# Altium footprint library Velvet_Controller_v1.1_2022.PcbLib: 82 footprints (part 1 of 6)
Each footprint in its own frame and in the unit in brackets; x right, y up, seen from the top. Pads: shape width x height; smd on the part's side, far side on the other; paste and mask are expansions set on the pad; w line width, h text height; cw(c..) or ccw(c..) is an arc to the next point about the centre after c.
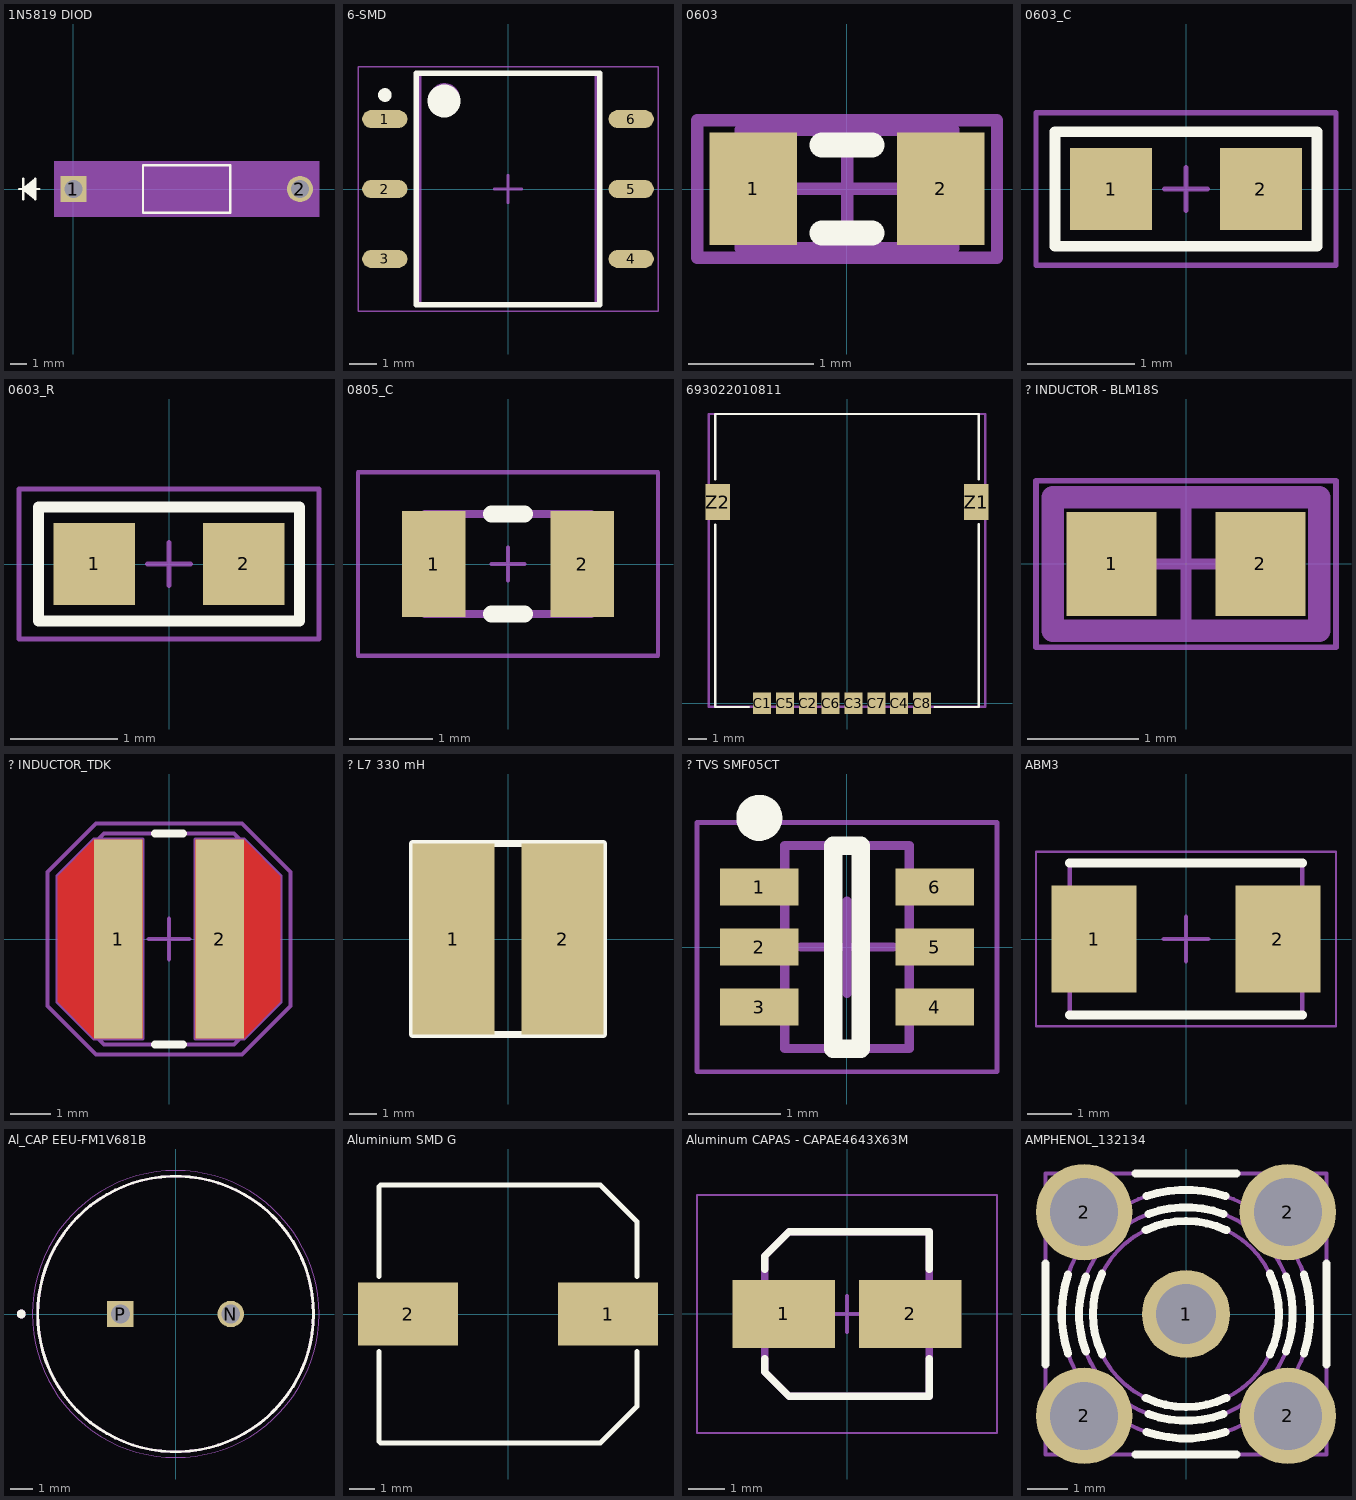
[diagram p0: the footprints below, top view; thin cyan lines are the x and y axes]

## 1N5819 DIOD [mil] "DO-41_STM"
pads (2):
  rect 64x64 hole 44 mask+0: 1(0,0)
  round 64 hole 44 mask+0: 2(557,0)
Top Overlay:
  lines w6: -134,0 -84,0 ; -124,-25 -124,25 ; -94,-20 -124,0 ; -94,-15 -124,0 ; -94,-10 -124,0 ; -94,-5 -124,0 ; -94,5 -124,0 ; -94,10 -124,0 ; -94,15 -124,0 ; -94,20 -124,0 ; -124,0 -94,25 -94,-25 -124,0 ; 171,-58 386,-58 386,58 171,58 171,-58
Mechanical 5:
  region: 604,-68 -47,-68 -47,68 604,68
Mechanical 13:
  lines w1: -134,0 -84,0 ; -124,-25 -124,25 ; -94,-20 -124,0 ; -94,-15 -124,0 ; -94,-10 -124,0 ; -94,-5 -124,0 ; -94,5 -124,0 ; -94,10 -124,0 ; -94,15 -124,0 ; -94,20 -124,0 ; 0,0 176,0 ; 381,0 557,0 ; -124,0 -94,25 -94,-25 -124,0 ; 176,-53 381,-53 381,53 176,53 176,-53
Mechanical 15:
  region: 166,-42 -42,-42 -42,42 166,42 166,63 391,63 391,42 599,42 599,-42 391,-42 391,-63 166,-63
  region: 381,-53 176,-53 176,53 381,53
  lines w6: -42,-42 -42,42 166,42 166,63 391,63 391,42 599,42 599,-42 391,-42 391,-63 166,-63 166,-42 -42,-42
3D body "DO-41_STM.step": height 106.06, standoff -100, extent -17.01,-53.1 574.02,53.1

## 6-SMD [mm] "Body 8.3x6.3mm; pitch 2.54mm"
height 4.5
pads (6):
  oval 1.65x0.65 smd: 1(-4.475,2.54) 2(-4.475,0) 3(-4.475,-2.54) 4(4.475,-2.54) 5(4.475,0) 6(4.475,2.54)
Top Overlay:
  circle w0.6: c-2.325,3.2 r0.3
  circle w0.25: c-4.475,3.415 r0.125
  lines w0.2: -3.325,-4.2 3.325,-4.2 3.325,4.2 -3.325,4.2 -3.325,-4.2
Mechanical 13:
  circle w0.1: c-2.3,3.3 r0.5
  lines w0.1: -3.2,-4.2 3.2,-4.2 3.2,4.2 -3.2,4.2 -3.2,-4.2
Mechanical 15:
  lines w0.05: -5.45,-4.45 5.45,-4.45 5.45,4.45 -5.45,4.45 -5.45,-4.45
  lines w0.1: -0.5,0 0.5,0 ; 0,-0.5 0,0.5
3D body "User Library-SOP-6.step": height 4.08, standoff 0, extent -4.575,-4.23 4.59,4.28

## 0603 [mm] "Chip Resistor, Body 1.6x0.8mm, IPC High Density"
height 0.9
pads (2):
  rect 0.7x0.9 smd: 1(-0.75,0) 2(0.75,0)
Top Overlay:
  lines w0.2: -0.2,-0.35 0.2,-0.35 ; -0.2,0.35 0.2,0.35
Mechanical 13:
  lines w0.1: -0.85,-0.475 0.85,-0.475 0.85,0.475 -0.85,0.475 -0.85,-0.475
Mechanical 15:
  lines w0.1: -0.475,0 0.475,0 ; 0,-0.475 0,0.475 ; -1.2,-0.55 1.2,-0.55 1.2,0.55 -1.2,0.55 -1.2,-0.55
3D body "0603.STEP": height 0.95, standoff 0, extent -0.8,-0.4 0.8,0.4

## 0603_C [mil] "Capacitor"
height 33.46
pads (2):
  rect 30x30 smd: 1(-27.5,0) 2(27.5,0)
Top Overlay:
  lines w4: -48,-21 -48,21 48,21 48,-21 -48,-21
Mechanical 15:
  lines w1.97: -7.87,0 7.87,0 ; 0,-7.87 0,7.87 ; -55,-28 -55,28 55,28 55,-28 -55,-28
3D body: height 33.46, standoff 0, extent -34.9,-15 -23.09,15
3D body: height 33.46, standoff 0, extent 23.1,-15 34.91,15
3D body: height 33.46, standoff 0, extent -23.05,-15 23.05,15

## 0603_R [mil]
height 23.62
pads (2):
  rect 30x30 smd: 1(-27.5,0) 2(27.5,0)
Top Overlay:
  lines w4: -48,-21 -48,21 48,21 48,-21 -48,-21
Mechanical 15:
  lines w1.97: -7.87,0 0,0 ; 0,-7.87 0,0 ; 0,7.87 0,0 ; 7.87,0 0,0 ; -55.12,-27.56 55.12,-27.56 55.12,27.56 -55.12,27.56 -55.12,-27.56
3D body: height 23.62, standoff 0, extent -23.04,-15 23.05,15
3D body: height 23.62, standoff 0, extent -34.9,-15 -23.09,15
3D body: height 23.62, standoff 0, extent 23.1,-15 34.91,15

## 0805_C [mil]
height 21.65
pads (2):
  rect 30x50 smd: 1(-35,0) 2(35,0)
Top Overlay:
  lines w7.87: -7.87,-23.62 7.87,-23.62 ; -7.87,23.62 7.87,23.62
Mechanical 13:
  lines w3.94: -31.5,-23.62 -31.5,23.62 ; 31.5,-23.62 31.5,23.62 ; -39.37,-23.62 -39.37,23.62 39.37,23.62 39.37,-23.62 -39.37,-23.62
Mechanical 15:
  lines w1.97: -7.87,0 0,0 ; 0,-7.87 0,7.87 ; 7.87,0 0,0 ; 0,0 0,0 ; -70.87,-43.31 -70.87,43.31 70.87,43.31 70.87,-43.31 -70.87,-43.31
3D body: height 21.65, standoff 0, extent -39.35,-23.6 -31.52,23.6
3D body: height 21.65, standoff 0, extent 31.52,-23.6 39.35,23.6
3D body: height 21.65, standoff 0, extent -31.5,-23.62 31.52,23.62

## 693022010811 [mm]
pads (10):
  rect 1x1.2 smd: C1(-4.72,0) C2(-2.18,0) C3(0.36,0) C4(2.9,0) C5(-3.45,0) C6(-0.91,0) C7(1.63,0) C8(4.17,0)
  rect 1.35x2 smd: Z1(7.2,11.2) Z2(-7.2,11.2)
Top Overlay:
  lines w0.127: -7.33,9.95 -7.33,-0.21 -5.475,-0.21 ; -7.33,12.45 -7.33,16.1 7.33,16.1 7.33,12.475 ; 4.875,-0.21 7.33,-0.21 7.33,9.975
Mechanical 13:
  lines w0.127: -7.7,-0.2 -7.7,16.1 7.7,16.1 7.7,-0.2 -7.7,-0.2
3D body "693022010811.stp": height 2.07, standoff -0.06, extent -7.7,-0.21 7.7,16.09

## ? INDUCTOR - BLM18S [mm] "Chip Inductor, 2-Leads, Body 1,60x0,80mm, IPC Medium Density"
height 0.6
pads (2):
  rect 0.81x0.94 smd: 1(-0.67,0) 2(0.67,0)
Mechanical 13:
  lines w0.2: -1.2,-0.6 -1.2,0.6 1.2,0.6 1.2,-0.6 -1.2,-0.6
Mechanical 15:
  lines w0.05: -1.35,-0.75 -1.35,0.75 1.35,0.75 1.35,-0.75 -1.35,-0.75
  lines w0.1: -0.5,0 0.5,0 ; 0,-0.5 0,0.5
3D body: height 0.6, standoff 0, extent -0.45,-0.45 0.45,0.45
3D body: height 0.6, standoff 0, extent -0.85,-0.45 -0.45,0.45
3D body: height 0.6, standoff 0, extent 0.45,-0.45 0.85,0.45

## ? INDUCTOR_TDK [mm] "VLS252012T-2R2M1R3"
height 2
pads (2):
  rect 1.2x4.9 smd: 1(-1.25,0) 2(1.25,0)
Top Layer:
  region: 2.75,1.55 1.85,2.45 0.65,2.45 0.65,-2.45 1.85,-2.45 2.75,-1.55
  region: -2.75,-1.55 -1.85,-2.45 -0.65,-2.45 -0.65,2.45 -1.85,2.45 -2.75,1.55
Top Overlay:
  lines w0.2: -0.35,-2.6 0.35,-2.6 ; -0.35,2.6 0.35,2.6
Top Paste:
  region: 2.75,1.55 1.85,2.45 0.65,2.45 0.65,-2.45 1.85,-2.45 2.75,-1.55
  region: -2.75,-1.55 -1.85,-2.45 -0.65,-2.45 -0.65,2.45 -1.85,2.45 -2.75,1.55
Top Solder:
  region: -2.85,-1.591 -1.891,-2.55 -0.55,-2.55 -0.55,2.55 -1.891,2.55 -2.85,1.591
  region: 2.85,1.591 1.891,2.55 0.55,2.55 0.55,-2.55 1.891,-2.55 2.85,-1.591
Mechanical 8:
  lines w0.1: -2.2,0 -1.7,0 ; -1.7,-0.5 -1.7,0 ; -1.7,0.5 -1.7,0 ; -1.25,-0.5 -1.25,0 ; -1.25,0.5 -1.25,0 ; -0.75,0 -1.25,0 ; -0.5,0 0,0 ; 0,-0.5 0,0 ; 0,0.5 0,0 ; 0.5,0 0,0 ; 0.75,0 1.25,0 ; 1.25,-0.5 1.25,0 ; 1.25,0.5 1.25,0 ; 1.7,-0.5 1.7,0 ; 1.7,0.5 1.7,0 ; 2.2,0 1.7,0 ; -2.75,-1.55 -1.85,-2.45 -0.65,-2.45 -0.65,2.45 -1.85,2.45 -2.75,1.55 -2.75,-1.55 ; 0.65,-2.45 1.85,-2.45 2.75,-1.55 2.75,1.55 1.85,2.45 0.65,2.45 0.65,-2.45
Mechanical 14:
  lines w0.1: -2.6,-1.6 -2.6,1.6 -1.6,2.6 1.6,2.6 2.6,1.6 2.6,-1.6 1.6,-2.6 -1.6,-2.6 -2.6,-1.6
Mechanical 15:
  lines w0.1: -3,-1.654 -1.804,-2.85 1.804,-2.85 3,-1.654 3,1.654 1.804,2.85 -1.804,2.85 -3,1.654 -3,-1.654
3D body "IND_TDK_VLCF5020-1.stp": height 2, standoff 0, extent -2.6,-2.6 2.6,2.6

## ? L7 330 mH [mm] "7x7x4mm inductor"
height 4
pads (2):
  rect 3x7 smd: 1(-2,0) 2(2,0)
Top Overlay:
  lines w0.254: -3.5,-3.5 -3.5,3.5 3.5,3.5 3.5,-3.5 -3.5,-3.5
3D body: height 4.1, standoff 0.1, extent -2.5,-2.497 2.5,2.497
3D body: height 4, standoff 0, extent -3.5,-3.5 3.5,3.5

## ? TVS SMF05CT [mm] "SOT363, 6-Leads"
height 1.1
pads (6):
  rect 0.85x0.4 smd: 1(-0.95,0.65) 2(-0.95,0) 3(-0.95,-0.65) 4(0.95,-0.65) 5(0.95,0) 6(0.95,0.65)
Top Overlay:
  circle w0.25: c-0.95,1.4 r0.125
  lines w0.2: -0.15,-1.1 0.15,-1.1 0.15,1.1 -0.15,1.1 -0.15,-1.1
Mechanical 13:
  lines w0.1: -0.675,-1.1 -0.675,1.1 0.675,1.1 0.675,-1.1 -0.675,-1.1
Mechanical 15:
  lines w0.05: -1.625,-1.35 -1.625,1.35 1.625,1.35 1.625,-1.35 -1.625,-1.35
  lines w0.1: -0.5,0 0.5,0 ; 0,-0.5 0,0.5
3D body: height 1.1, standoff 0, extent -0.675,-1.1 0.675,1.1

## ABM3 [mm] "ABM3 Miniature Ceramic SMD Crystal from Abracon. 5 mm x 3.2 mm x 1.3mm."
height 1.3
pads (2):
  rect 1.9x2.4 smd: 1(-2.05,0) 2(2.05,0)
Top Overlay:
  lines w0.2: -2.6,-1.7 2.6,-1.7 ; -2.6,1.7 2.6,1.7
Mechanical 13:
  lines w0.1: -2.6,-1.7 2.6,-1.7 2.6,1.7 -2.6,1.7 -2.6,-1.7
Mechanical 15:
  lines w0.05: -3.35,-1.95 3.35,-1.95 3.35,1.95 -3.35,1.95 -3.35,-1.95
  lines w0.1: -0.5,0 0.5,0 ; 0,-0.5 0,0.5
3D body "ABM3.STEP": height 1.3, standoff 0, extent -2.6,-1.7 2.6,1.7

## Al_CAP EEU-FM1V681B [mm] "35 V 350 uF"
pads (2):
  round 1.2 hole 0.85: N(2.5,0)
  rect 1.2x1.2 hole 0.85: P(-2.5,0)
Top Overlay:
  circle w0.2: c-7,0 r0.1
  circle w0.127: c0,0 r6.25
Mechanical 13:
  circle w0.2: c-7,0 r0.1
  circle w0.127: c0,0 r6.25
Mechanical 15:
  circle w0.05: c0,0 r6.5
3D body "step_temp.STEP": height 20, standoff -17, extent -6.25,-6.249 6.25,6.249

## Aluminium SMD G [mm] "ALU-G(O=10.0mm, ?=10.3mm, h=10.2mm)"
height 10.2
pads (2):
  rect 4x2.5 smd: 1(4,0) 2(-4,0)
Top Overlay:
  lines w0.2: -5.15,-1.5 -5.15,-5.1 -5.1,-5.15 3.7,-5.15 5.15,-3.7 5.15,-1.5 ; -5.15,1.5 -5.15,5.1 -5.1,5.15 3.7,5.15 5.15,3.7 5.15,1.5
3D body "ALU-G(O=10.0mm, ?=10.3mm, h=10.2mm).STEP": height 10.2, standoff 0, extent -5.8,-5.15 5.8,5.15

## Aluminum CAPAS - CAPAE4643X63M [mm] "Aluminum Electrolytic Capacitor, Body 4,30x4,30x6,30mm, IPC Low Density"
height 6.3
pads (2):
  rect 2.8x1.85 smd: 1(-1.725,0) 2(1.725,0)
Top Overlay:
  lines w0.2: -2.25,-1.225 -2.25,-1.587 -1.587,-2.25 2.25,-2.25 2.25,-1.225 ; -2.25,1.225 -2.25,1.587 -1.587,2.25 2.25,2.25 2.25,1.225
Mechanical 13:
  lines w0.2: -2.25,-1.587 -2.25,1.587 -1.587,2.25 2.25,2.25 2.25,-2.25 -1.587,-2.25 -2.25,-1.587
Mechanical 15:
  lines w0.05: -4.1,-3.25 4.1,-3.25 4.1,3.25 -4.1,3.25 -4.1,-3.25
  lines w0.1: -0.5,0 0.5,0 ; 0,-0.5 0,0.5
3D body: height 6.3, standoff 0, extent -2.25,-2.25 2.25,2.243
3D body: height 2.1, standoff 0, extent -2.25,-2.25 2.25,2.25

## AMPHENOL_132134 [mm] "50 Ohm Through Hole SMA Straight PCB Jack"
height 9.53
pads (5):
  round 2.2 hole 1.5: 1(0,0)
  round 2.4 hole 1.7: 2(-2.54,-2.54) 2(-2.54,2.54) 2(2.54,-2.54) 2(2.54,2.54)
Top Overlay:
  lines w0.2: -3.5,-1.26 -3.5,1.26 ; -2.939,-0.991 cw(c-0.001,-0.001) -2.938,0.99 ; -2.495,-0.941 cw(c-0.003,0) -2.495,0.941 ; -2.094,-1.003 cw(c-0.002,0) -2.094,1.003 ; -1.26,-3.5 1.26,-3.5 ; -1.26,3.5 1.26,3.5 ; -1.004,-2.093 ccw(c-0.002,0) 1.004,-2.09 ; -1.004,2.093 cw(c-0.002,0) 1.004,2.09 ; -0.991,-2.94 ccw(c-0.001,-0.001) 0.991,-2.939 ; -0.99,2.937 cw(c-0.001,-0.001) 0.99,2.937 ; -0.941,-2.494 ccw(c-0.003,0) 0.941,-2.492 ; -0.941,2.493 cw(c-0.003,0) 0.941,2.491 ; 2.089,-1.005 ccw(c-0.002,0) 2.089,1.005 ; 2.489,-0.941 ccw(c-0.003,0) 2.489,0.941 ; 2.938,-0.99 ccw(c-0.001,-0.001) 2.937,0.99 ; 3.5,-1.26 3.5,1.26
Mechanical 8:
  lines w0.1: -3.04,-2.54 -2.54,-2.54 ; -3.04,2.54 -2.54,2.54 ; -2.54,-3.04 -2.54,-2.54 ; -2.54,-2.04 -2.54,-2.54 ; -2.54,2.04 -2.54,2.54 ; -2.54,3.04 -2.54,2.54 ; -2.04,-2.54 -2.54,-2.54 ; -2.04,2.54 -2.54,2.54 ; -0.5,0 0,0 ; 0,-0.5 0,0 ; 0,0.5 0,0 ; 0.5,0 0,0 ; 2.04,-2.54 2.54,-2.54 ; 2.04,2.54 2.54,2.54 ; 2.54,-3.04 2.54,-2.54 ; 2.54,-2.04 2.54,-2.54 ; 2.54,2.04 2.54,2.54 ; 2.54,3.04 2.54,2.54 ; 3.04,-2.54 2.54,-2.54 ; 3.04,2.54 2.54,2.54
Mechanical 14:
  circle w0.1: c-0.001,-0.001 r3.101
  circle w0.1: c-0.002,0 r2.32
  circle w0.1: c0,-0.011 r0.465
  circle w0.1: c0,0 r0.635
  circle w0.1: c-0.003,0 r2.664
  lines w0.1: -3.5,-3.5 3.5,-3.5 3.5,3.5 -3.5,3.5 -3.5,-3.5
3D body "AMPHENOL_132134.stp": height 9.53, standoff -3.94, extent -3.5,-3.5 3.5,3.5